# Altium schematic symbol library jlcpcb_2025_04_capacitors_extended_0201.schlib: 1175 symbols (part 3 of 7) (continued)
## FN03N470J500PLG
designator C?  Capacitance: 47pF  (hidden comment: *)
Capacitor, Ceramic (MLCC), 47pF, ±5%, 50V, C0G, ±5%, SMD 0201; Manufacturer: PSA(Prosperity Dielectrics); Manufacturer Part Number: FN03N470J500PLG; Package Size: 0201; JLCPCB Basic Part: No; JLCPCB Part Number: C561719; Supplier 1: LCSC; Category: Capacitors - MLCC; Supplier Part Number 1: C561719; Tolerance: ±5%; Voltage Rating: 50V; Temperature Coefficient: C0G; RoHS: Yes; ComponentLink1Description: Datasheet; ComponentLink2Description: JLCPCB Part URL; ComponentLink2URL: https://jlcpcb.com/partdetail/C561719; ComponentLink3Description: LCSC Part URL; ComponentLink3URL: https://lcsc.com/product-detail/Multilayer-Ceramic-Capacitors-MLCC---SMD-SMT_PSAProsperity-Dielectrics-PSAProsperity-Dielectrics-FN03N470J500PLG_C561719.html
footprint CAP-0201 (0201 (0603M) Capacitor)
pins: 1, 2

## FN03N560J500PLG
designator C?  Capacitance: 56pF  (hidden comment: *)
Capacitor, Ceramic (MLCC), 56pF, ±5%, 50V, C0G, ±5%, SMD 0201; Manufacturer: PSA(Prosperity Dielectrics); Manufacturer Part Number: FN03N560J500PLG; Package Size: 0201; JLCPCB Basic Part: No; JLCPCB Part Number: C561720; Supplier 1: LCSC; Category: Capacitors - MLCC; Supplier Part Number 1: C561720; Tolerance: ±5%; Voltage Rating: 50V; Temperature Coefficient: C0G; RoHS: Yes; ComponentLink1Description: Datasheet; ComponentLink2Description: JLCPCB Part URL; ComponentLink2URL: https://jlcpcb.com/partdetail/C561720; ComponentLink3Description: LCSC Part URL; ComponentLink3URL: https://lcsc.com/product-detail/Multilayer-Ceramic-Capacitors-MLCC---SMD-SMT_PSAProsperity-Dielectrics-PSAProsperity-Dielectrics-FN03N560J500PLG_C561720.html
footprint CAP-0201 (0201 (0603M) Capacitor)
pins: 1, 2

## FN03N680J500PLG
designator C?  Capacitance: 68pF  (hidden comment: *)
Capacitor, Ceramic (MLCC), 68pF, ±5%, 50V, C0G, ±5%, SMD 0201; Manufacturer: PSA(Prosperity Dielectrics); Manufacturer Part Number: FN03N680J500PLG; Package Size: 0201; JLCPCB Basic Part: No; JLCPCB Part Number: C561721; Supplier 1: LCSC; Category: Capacitors - MLCC; Supplier Part Number 1: C561721; Tolerance: ±5%; Voltage Rating: 50V; Temperature Coefficient: C0G; RoHS: Yes; ComponentLink1Description: Datasheet; ComponentLink2Description: JLCPCB Part URL; ComponentLink2URL: https://jlcpcb.com/partdetail/C561721; ComponentLink3Description: LCSC Part URL; ComponentLink3URL: https://lcsc.com/product-detail/Multilayer-Ceramic-Capacitors-MLCC---SMD-SMT_PSAProsperity-Dielectrics-PSAProsperity-Dielectrics-FN03N680J500PLG_C561721.html
footprint CAP-0201 (0201 (0603M) Capacitor)
pins: 1, 2

## FN03N820J500PLG
designator C?  Capacitance: 82pF  (hidden comment: *)
Capacitor, Ceramic (MLCC), 82pF, ±5%, 50V, C0G, ±5%, SMD 0201; Manufacturer: PSA(Prosperity Dielectrics); Manufacturer Part Number: FN03N820J500PLG; Package Size: 0201; JLCPCB Basic Part: No; JLCPCB Part Number: C561722; Supplier 1: LCSC; Category: Capacitors - MLCC; Supplier Part Number 1: C561722; Tolerance: ±5%; Voltage Rating: 50V; Temperature Coefficient: C0G; RoHS: Yes; ComponentLink1Description: Datasheet; ComponentLink2Description: JLCPCB Part URL; ComponentLink2URL: https://jlcpcb.com/partdetail/C561722; ComponentLink3Description: LCSC Part URL; ComponentLink3URL: https://lcsc.com/product-detail/Multilayer-Ceramic-Capacitors-MLCC---SMD-SMT_PSAProsperity-Dielectrics-PSAProsperity-Dielectrics-FN03N820J500PLG_C561722.html
footprint CAP-0201 (0201 (0603M) Capacitor)
pins: 1, 2

## FN03X102K500PLG
designator C?  Capacitance: 1nF  (hidden comment: *)
Capacitor, Ceramic (MLCC), 1nF, ±10%, 50V, X7R, ±10%, SMD 0201; Manufacturer: PSA(Prosperity Dielectrics); Manufacturer Part Number: FN03X102K500PLG; Package Size: 0201; JLCPCB Basic Part: No; JLCPCB Part Number: C2874741; Supplier 1: LCSC; Category: Capacitors - MLCC; Supplier Part Number 1: C2874741; Tolerance: ±10%; Voltage Rating: 50V; Temperature Coefficient: X7R; RoHS: Yes; ComponentLink1Description: Datasheet; ComponentLink1URL: https://wmsc.lcsc.com/wmsc/upload/file/pdf/v2/lcsc/2108150330_PSA-Prosperity-Dielectrics-FN03X102K500PLG_C2874741.pdf; ComponentLink2Description: JLCPCB Part URL; ComponentLink2URL: https://jlcpcb.com/partdetail/C2874741; ComponentLink3Description: LCSC Part URL; ComponentLink3URL: https://lcsc.com/product-detail/Multilayer-Ceramic-Capacitors-MLCC---SMD-SMT_PSAProsperity-Dielectrics-PSAProsperity-Dielectrics-FN03X102K500PLG_C2874741.html
footprint CAP-0201 (0201 (0603M) Capacitor)
pins: 1, 2

## FN03X103K100PLG
designator C?  Capacitance: 10nF  (hidden comment: *)
Capacitor, Ceramic (MLCC), 10nF, ±10%, 10V, X7R, ±10%, SMD 0201; Manufacturer: PSA(Prosperity Dielectrics); Manufacturer Part Number: FN03X103K100PLG; Package Size: 0201; JLCPCB Basic Part: No; JLCPCB Part Number: C2929123; Supplier 1: LCSC; Category: Capacitors - MLCC; Supplier Part Number 1: C2929123; Tolerance: ±10%; Voltage Rating: 10V; Temperature Coefficient: X7R; RoHS: Yes; ComponentLink1Description: Datasheet; ComponentLink1URL: https://wmsc.lcsc.com/wmsc/upload/file/pdf/v2/lcsc/2201121400_PSA-Prosperity-Dielectrics-FN03X103K100PLG_C2929123.pdf; ComponentLink2Description: JLCPCB Part URL; ComponentLink2URL: https://jlcpcb.com/partdetail/C2929123; ComponentLink3Description: LCSC Part URL; ComponentLink3URL: https://lcsc.com/product-detail/Multilayer-Ceramic-Capacitors-MLCC---SMD-SMT_PSAProsperity-Dielectrics-PSAProsperity-Dielectrics-FN03X103K100PLG_C2929123.html
footprint CAP-0201 (0201 (0603M) Capacitor)
pins: 1, 2

## FN03X151K160PLG
designator C?  Capacitance: 150pF  (hidden comment: *)
Capacitor, Ceramic (MLCC), 150pF, ±10%, 16V, X7R, ±10%, SMD 0201; Manufacturer: PSA(Prosperity Dielectrics); Manufacturer Part Number: FN03X151K160PLG; Package Size: 0201; JLCPCB Basic Part: No; JLCPCB Part Number: C565525; Supplier 1: LCSC; Category: Capacitors - MLCC; Supplier Part Number 1: C565525; Tolerance: ±10%; Voltage Rating: 16V; Temperature Coefficient: X7R; RoHS: Yes; ComponentLink1Description: Datasheet; ComponentLink2Description: JLCPCB Part URL; ComponentLink2URL: https://jlcpcb.com/partdetail/C565525; ComponentLink3Description: LCSC Part URL; ComponentLink3URL: https://lcsc.com/product-detail/Multilayer-Ceramic-Capacitors-MLCC---SMD-SMT_PSAProsperity-Dielectrics-PSAProsperity-Dielectrics-FN03X151K160PLG_C565525.html
footprint CAP-0201 (0201 (0603M) Capacitor)
pins: 1, 2

## FN03X151K250PLG
designator C?  Capacitance: 150pF  (hidden comment: *)
Capacitor, Ceramic (MLCC), 150pF, ±10%, 25V, ±10%, SMD 0201; Manufacturer: PSA(Prosperity Dielectrics); Manufacturer Part Number: FN03X151K250PLG; Package Size: 0201; JLCPCB Basic Part: No; JLCPCB Part Number: C565526; Supplier 1: LCSC; Category: Capacitors - MLCC; Supplier Part Number 1: C565526; Tolerance: ±10%; Voltage Rating: 25V; RoHS: Yes; ComponentLink1Description: Datasheet; ComponentLink2Description: JLCPCB Part URL; ComponentLink2URL: https://jlcpcb.com/partdetail/C565526; ComponentLink3Description: LCSC Part URL; ComponentLink3URL: https://lcsc.com/product-detail/Multilayer-Ceramic-Capacitors-MLCC---SMD-SMT_PSAProsperity-Dielectrics-PSAProsperity-Dielectrics-FN03X151K250PLG_C565526.html
footprint CAP-0201 (0201 (0603M) Capacitor)
pins: 1, 2

## FN03X151K500PLG
designator C?  Capacitance: 150pF  (hidden comment: *)
Capacitor, Ceramic (MLCC), 150pF, ±10%, 50V, ±10%, SMD 0201; Manufacturer: PSA(Prosperity Dielectrics); Manufacturer Part Number: FN03X151K500PLG; Package Size: 0201; JLCPCB Basic Part: No; JLCPCB Part Number: C565527; Supplier 1: LCSC; Category: Capacitors - MLCC; Supplier Part Number 1: C565527; Tolerance: ±10%; Voltage Rating: 50V; RoHS: Yes; ComponentLink1Description: Datasheet; ComponentLink2Description: JLCPCB Part URL; ComponentLink2URL: https://jlcpcb.com/partdetail/C565527; ComponentLink3Description: LCSC Part URL; ComponentLink3URL: https://lcsc.com/product-detail/Multilayer-Ceramic-Capacitors-MLCC---SMD-SMT_PSAProsperity-Dielectrics-PSAProsperity-Dielectrics-FN03X151K500PLG_C565527.html
footprint CAP-0201 (0201 (0603M) Capacitor)
pins: 1, 2

## FN03X221K250PLG
designator C?  Capacitance: 220pF  (hidden comment: *)
Capacitor, Ceramic (MLCC), 220pF, ±10%, 25V, X7R, ±10%, SMD 0201; Manufacturer: PSA(Prosperity Dielectrics); Manufacturer Part Number: FN03X221K250PLG; Package Size: 0201; JLCPCB Basic Part: No; JLCPCB Part Number: C565495; Supplier 1: LCSC; Category: Capacitors - MLCC; Supplier Part Number 1: C565495; Tolerance: ±10%; Voltage Rating: 25V; Temperature Coefficient: X7R; RoHS: Yes; ComponentLink1Description: Datasheet; ComponentLink2Description: JLCPCB Part URL; ComponentLink2URL: https://jlcpcb.com/partdetail/C565495; ComponentLink3Description: LCSC Part URL; ComponentLink3URL: https://lcsc.com/product-detail/Multilayer-Ceramic-Capacitors-MLCC---SMD-SMT_PSAProsperity-Dielectrics-PSAProsperity-Dielectrics-FN03X221K250PLG_C565495.html
footprint CAP-0201 (0201 (0603M) Capacitor)
pins: 1, 2

## FN03X222K6R3PLG
designator C?  Capacitance: 2.2nF  (hidden comment: *)
Capacitor, Ceramic (MLCC), 2.2nF, ±10%, 6.3V, X7R, ±10%, SMD 0201; Manufacturer: PSA(Prosperity Dielectrics); Manufacturer Part Number: FN03X222K6R3PLG; Package Size: 0201; JLCPCB Basic Part: No; JLCPCB Part Number: C565530; Supplier 1: LCSC; Category: Capacitors - MLCC; Supplier Part Number 1: C565530; Tolerance: ±10%; Voltage Rating: 6.3V; Temperature Coefficient: X7R; RoHS: Yes; ComponentLink1Description: Datasheet; ComponentLink2Description: JLCPCB Part URL; ComponentLink2URL: https://jlcpcb.com/partdetail/C565530; ComponentLink3Description: LCSC Part URL; ComponentLink3URL: https://lcsc.com/product-detail/Multilayer-Ceramic-Capacitors-MLCC---SMD-SMT_PSAProsperity-Dielectrics-PSAProsperity-Dielectrics-FN03X222K6R3PLG_C565530.html
footprint CAP-0201 (0201 (0603M) Capacitor)
pins: 1, 2

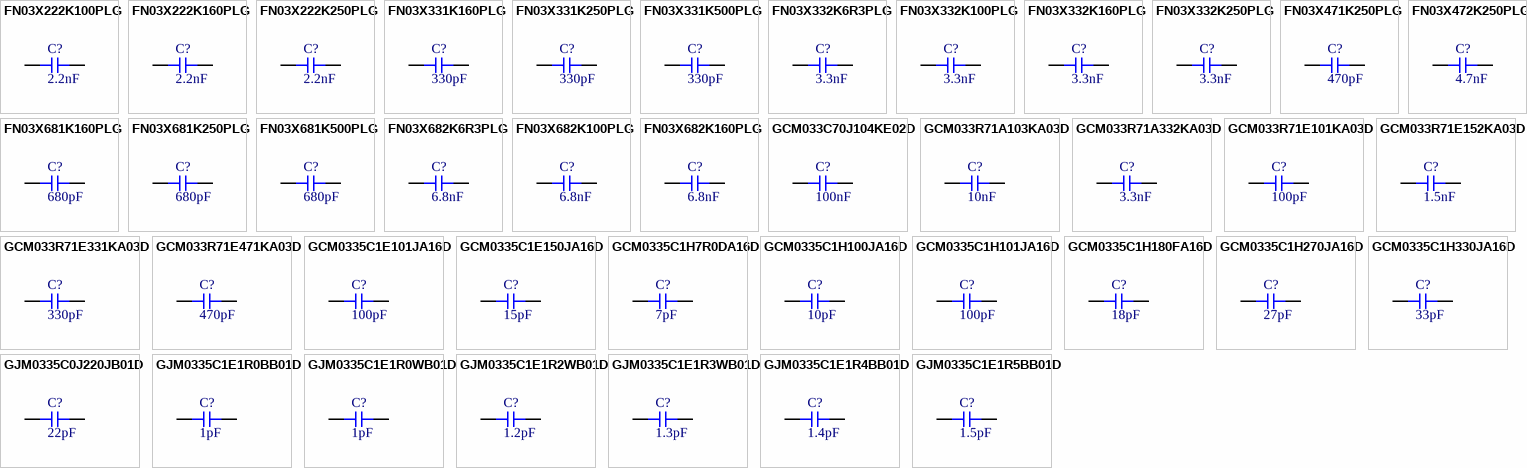
[diagram p13: symbols FN03X222K100PLG to GJM0335C1E1R5BB01D]

## FN03X222K100PLG
designator C?  Capacitance: 2.2nF  (hidden comment: *)
Capacitor, Ceramic (MLCC), 2.2nF, ±10%, 10V, X7R, ±10%, SMD 0201; Manufacturer: PSA(Prosperity Dielectrics); Manufacturer Part Number: FN03X222K100PLG; Package Size: 0201; JLCPCB Basic Part: No; JLCPCB Part Number: C565528; Supplier 1: LCSC; Category: Capacitors - MLCC; Supplier Part Number 1: C565528; Tolerance: ±10%; Voltage Rating: 10V; Temperature Coefficient: X7R; RoHS: Yes; ComponentLink1Description: Datasheet; ComponentLink2Description: JLCPCB Part URL; ComponentLink2URL: https://jlcpcb.com/partdetail/C565528; ComponentLink3Description: LCSC Part URL; ComponentLink3URL: https://lcsc.com/product-detail/Multilayer-Ceramic-Capacitors-MLCC---SMD-SMT_PSAProsperity-Dielectrics-PSAProsperity-Dielectrics-FN03X222K100PLG_C565528.html
footprint CAP-0201 (0201 (0603M) Capacitor)
pins: 1, 2

## FN03X222K160PLG
designator C?  Capacitance: 2.2nF  (hidden comment: *)
Capacitor, Ceramic (MLCC), 2.2nF, ±10%, 16V, X7R, ±10%, SMD 0201; Manufacturer: PSA(Prosperity Dielectrics); Manufacturer Part Number: FN03X222K160PLG; Package Size: 0201; JLCPCB Basic Part: No; JLCPCB Part Number: C565529; Supplier 1: LCSC; Category: Capacitors - MLCC; Supplier Part Number 1: C565529; Tolerance: ±10%; Voltage Rating: 16V; Temperature Coefficient: X7R; RoHS: Yes; ComponentLink1Description: Datasheet; ComponentLink2Description: JLCPCB Part URL; ComponentLink2URL: https://jlcpcb.com/partdetail/C565529; ComponentLink3Description: LCSC Part URL; ComponentLink3URL: https://lcsc.com/product-detail/Multilayer-Ceramic-Capacitors-MLCC---SMD-SMT_PSAProsperity-Dielectrics-PSAProsperity-Dielectrics-FN03X222K160PLG_C565529.html
footprint CAP-0201 (0201 (0603M) Capacitor)
pins: 1, 2

## FN03X222K250PLG
designator C?  Capacitance: 2.2nF  (hidden comment: *)
Capacitor, Ceramic (MLCC), 2.2nF, ±10%, 25V, X7R, ±10%, SMD 0201; Manufacturer: PSA(Prosperity Dielectrics); Manufacturer Part Number: FN03X222K250PLG; Package Size: 0201; JLCPCB Basic Part: No; JLCPCB Part Number: C565496; Supplier 1: LCSC; Category: Capacitors - MLCC; Supplier Part Number 1: C565496; Tolerance: ±10%; Voltage Rating: 25V; Temperature Coefficient: X7R; RoHS: Yes; ComponentLink1Description: Datasheet; ComponentLink2Description: JLCPCB Part URL; ComponentLink2URL: https://jlcpcb.com/partdetail/C565496; ComponentLink3Description: LCSC Part URL; ComponentLink3URL: https://lcsc.com/product-detail/Multilayer-Ceramic-Capacitors-MLCC---SMD-SMT_PSAProsperity-Dielectrics-PSAProsperity-Dielectrics-FN03X222K250PLG_C565496.html
footprint CAP-0201 (0201 (0603M) Capacitor)
pins: 1, 2

## FN03X331K160PLG
designator C?  Capacitance: 330pF  (hidden comment: *)
Capacitor, Ceramic (MLCC), 330pF, ±10%, 16V, X7R, ±10%, SMD 0201; Manufacturer: PSA(Prosperity Dielectrics); Manufacturer Part Number: FN03X331K160PLG; Package Size: 0201; JLCPCB Basic Part: No; JLCPCB Part Number: C565531; Supplier 1: LCSC; Category: Capacitors - MLCC; Supplier Part Number 1: C565531; Tolerance: ±10%; Voltage Rating: 16V; Temperature Coefficient: X7R; RoHS: Yes; ComponentLink1Description: Datasheet; ComponentLink2Description: JLCPCB Part URL; ComponentLink2URL: https://jlcpcb.com/partdetail/C565531; ComponentLink3Description: LCSC Part URL; ComponentLink3URL: https://lcsc.com/product-detail/Multilayer-Ceramic-Capacitors-MLCC---SMD-SMT_PSAProsperity-Dielectrics-PSAProsperity-Dielectrics-FN03X331K160PLG_C565531.html
footprint CAP-0201 (0201 (0603M) Capacitor)
pins: 1, 2

## FN03X331K250PLG
designator C?  Capacitance: 330pF  (hidden comment: *)
Capacitor, Ceramic (MLCC), 330pF, ±10%, 25V, X7R, ±10%, SMD 0201; Manufacturer: PSA(Prosperity Dielectrics); Manufacturer Part Number: FN03X331K250PLG; Package Size: 0201; JLCPCB Basic Part: No; JLCPCB Part Number: C565532; Supplier 1: LCSC; Category: Capacitors - MLCC; Supplier Part Number 1: C565532; Tolerance: ±10%; Voltage Rating: 25V; Temperature Coefficient: X7R; RoHS: Yes; ComponentLink1Description: Datasheet; ComponentLink2Description: JLCPCB Part URL; ComponentLink2URL: https://jlcpcb.com/partdetail/C565532; ComponentLink3Description: LCSC Part URL; ComponentLink3URL: https://lcsc.com/product-detail/Multilayer-Ceramic-Capacitors-MLCC---SMD-SMT_PSAProsperity-Dielectrics-PSAProsperity-Dielectrics-FN03X331K250PLG_C565532.html
footprint CAP-0201 (0201 (0603M) Capacitor)
pins: 1, 2

## FN03X331K500PLG
designator C?  Capacitance: 330pF  (hidden comment: *)
Capacitor, Ceramic (MLCC), 330pF, ±10%, 50V, X7R, ±10%, SMD 0201; Manufacturer: PSA(Prosperity Dielectrics); Manufacturer Part Number: FN03X331K500PLG; Package Size: 0201; JLCPCB Basic Part: No; JLCPCB Part Number: C565533; Supplier 1: LCSC; Category: Capacitors - MLCC; Supplier Part Number 1: C565533; Tolerance: ±10%; Voltage Rating: 50V; Temperature Coefficient: X7R; RoHS: Yes; ComponentLink1Description: Datasheet; ComponentLink2Description: JLCPCB Part URL; ComponentLink2URL: https://jlcpcb.com/partdetail/C565533; ComponentLink3Description: LCSC Part URL; ComponentLink3URL: https://lcsc.com/product-detail/Multilayer-Ceramic-Capacitors-MLCC---SMD-SMT_PSAProsperity-Dielectrics-PSAProsperity-Dielectrics-FN03X331K500PLG_C565533.html
footprint CAP-0201 (0201 (0603M) Capacitor)
pins: 1, 2

## FN03X332K6R3PLG
designator C?  Capacitance: 3.3nF  (hidden comment: *)
Capacitor, Ceramic (MLCC), 3.3nF, ±10%, 6.3V, ±10%, SMD 0201; Manufacturer: PSA(Prosperity Dielectrics); Manufacturer Part Number: FN03X332K6R3PLG; Package Size: 0201; JLCPCB Basic Part: No; JLCPCB Part Number: C565537; Supplier 1: LCSC; Category: Capacitors - MLCC; Supplier Part Number 1: C565537; Tolerance: ±10%; Voltage Rating: 6.3V; RoHS: Yes; ComponentLink1Description: Datasheet; ComponentLink2Description: JLCPCB Part URL; ComponentLink2URL: https://jlcpcb.com/partdetail/C565537; ComponentLink3Description: LCSC Part URL; ComponentLink3URL: https://lcsc.com/product-detail/Multilayer-Ceramic-Capacitors-MLCC---SMD-SMT_PSAProsperity-Dielectrics-PSAProsperity-Dielectrics-FN03X332K6R3PLG_C565537.html
footprint CAP-0201 (0201 (0603M) Capacitor)
pins: 1, 2

## FN03X332K100PLG
designator C?  Capacitance: 3.3nF  (hidden comment: *)
Capacitor, Ceramic (MLCC), 3.3nF, ±10%, 10V, ±10%, SMD 0201; Manufacturer: PSA(Prosperity Dielectrics); Manufacturer Part Number: FN03X332K100PLG; Package Size: 0201; JLCPCB Basic Part: No; JLCPCB Part Number: C565534; Supplier 1: LCSC; Category: Capacitors - MLCC; Supplier Part Number 1: C565534; Tolerance: ±10%; Voltage Rating: 10V; RoHS: Yes; ComponentLink1Description: Datasheet; ComponentLink2Description: JLCPCB Part URL; ComponentLink2URL: https://jlcpcb.com/partdetail/C565534; ComponentLink3Description: LCSC Part URL; ComponentLink3URL: https://lcsc.com/product-detail/Multilayer-Ceramic-Capacitors-MLCC---SMD-SMT_PSAProsperity-Dielectrics-PSAProsperity-Dielectrics-FN03X332K100PLG_C565534.html
footprint CAP-0201 (0201 (0603M) Capacitor)
pins: 1, 2

## FN03X332K160PLG
designator C?  Capacitance: 3.3nF  (hidden comment: *)
Capacitor, Ceramic (MLCC), 3.3nF, ±10%, 16V, ±10%, SMD 0201; Manufacturer: PSA(Prosperity Dielectrics); Manufacturer Part Number: FN03X332K160PLG; Package Size: 0201; JLCPCB Basic Part: No; JLCPCB Part Number: C565535; Supplier 1: LCSC; Category: Capacitors - MLCC; Supplier Part Number 1: C565535; Tolerance: ±10%; Voltage Rating: 16V; RoHS: Yes; ComponentLink1Description: Datasheet; ComponentLink2Description: JLCPCB Part URL; ComponentLink2URL: https://jlcpcb.com/partdetail/C565535; ComponentLink3Description: LCSC Part URL; ComponentLink3URL: https://lcsc.com/product-detail/Multilayer-Ceramic-Capacitors-MLCC---SMD-SMT_PSAProsperity-Dielectrics-PSAProsperity-Dielectrics-FN03X332K160PLG_C565535.html
footprint CAP-0201 (0201 (0603M) Capacitor)
pins: 1, 2

## FN03X332K250PLG
designator C?  Capacitance: 3.3nF  (hidden comment: *)
Capacitor, Ceramic (MLCC), 3.3nF, ±10%, 25V, ±10%, SMD 0201; Manufacturer: PSA(Prosperity Dielectrics); Manufacturer Part Number: FN03X332K250PLG; Package Size: 0201; JLCPCB Basic Part: No; JLCPCB Part Number: C565536; Supplier 1: LCSC; Category: Capacitors - MLCC; Supplier Part Number 1: C565536; Tolerance: ±10%; Voltage Rating: 25V; RoHS: Yes; ComponentLink1Description: Datasheet; ComponentLink2Description: JLCPCB Part URL; ComponentLink2URL: https://jlcpcb.com/partdetail/C565536; ComponentLink3Description: LCSC Part URL; ComponentLink3URL: https://lcsc.com/product-detail/Multilayer-Ceramic-Capacitors-MLCC---SMD-SMT_PSAProsperity-Dielectrics-PSAProsperity-Dielectrics-FN03X332K250PLG_C565536.html
footprint CAP-0201 (0201 (0603M) Capacitor)
pins: 1, 2

## FN03X471K250PLG
designator C?  Capacitance: 470pF  (hidden comment: *)
Capacitor, Ceramic (MLCC), 470pF, ±10%, 25V, X7R, ±10%, SMD 0201; Manufacturer: PSA(Prosperity Dielectrics); Manufacturer Part Number: FN03X471K250PLG; Package Size: 0201; JLCPCB Basic Part: No; JLCPCB Part Number: C565497; Supplier 1: LCSC; Category: Capacitors - MLCC; Supplier Part Number 1: C565497; Tolerance: ±10%; Voltage Rating: 25V; Temperature Coefficient: X7R; RoHS: Yes; ComponentLink1Description: Datasheet; ComponentLink2Description: JLCPCB Part URL; ComponentLink2URL: https://jlcpcb.com/partdetail/C565497; ComponentLink3Description: LCSC Part URL; ComponentLink3URL: https://lcsc.com/product-detail/Multilayer-Ceramic-Capacitors-MLCC---SMD-SMT_PSAProsperity-Dielectrics-PSAProsperity-Dielectrics-FN03X471K250PLG_C565497.html
footprint CAP-0201 (0201 (0603M) Capacitor)
pins: 1, 2

## FN03X472K250PLG
designator C?  Capacitance: 4.7nF  (hidden comment: *)
Capacitor, Ceramic (MLCC), 4.7nF, ±10%, 25V, X7R, ±10%, SMD 0201; Manufacturer: PSA(Prosperity Dielectrics); Manufacturer Part Number: FN03X472K250PLG; Package Size: 0201; JLCPCB Basic Part: No; JLCPCB Part Number: C565498; Supplier 1: LCSC; Category: Capacitors - MLCC; Supplier Part Number 1: C565498; Tolerance: ±10%; Voltage Rating: 25V; Temperature Coefficient: X7R; RoHS: Yes; ComponentLink1Description: Datasheet; ComponentLink2Description: JLCPCB Part URL; ComponentLink2URL: https://jlcpcb.com/partdetail/C565498; ComponentLink3Description: LCSC Part URL; ComponentLink3URL: https://lcsc.com/product-detail/Multilayer-Ceramic-Capacitors-MLCC---SMD-SMT_PSAProsperity-Dielectrics-PSAProsperity-Dielectrics-FN03X472K250PLG_C565498.html
footprint CAP-0201 (0201 (0603M) Capacitor)
pins: 1, 2

## FN03X681K160PLG
designator C?  Capacitance: 680pF  (hidden comment: *)
Capacitor, Ceramic (MLCC), 680pF, ±10%, 16V, X7R, ±10%, SMD 0201; Manufacturer: PSA(Prosperity Dielectrics); Manufacturer Part Number: FN03X681K160PLG; Package Size: 0201; JLCPCB Basic Part: No; JLCPCB Part Number: C565538; Supplier 1: LCSC; Category: Capacitors - MLCC; Supplier Part Number 1: C565538; Tolerance: ±10%; Voltage Rating: 16V; Temperature Coefficient: X7R; RoHS: Yes; ComponentLink1Description: Datasheet; ComponentLink2Description: JLCPCB Part URL; ComponentLink2URL: https://jlcpcb.com/partdetail/C565538; ComponentLink3Description: LCSC Part URL; ComponentLink3URL: https://lcsc.com/product-detail/Multilayer-Ceramic-Capacitors-MLCC---SMD-SMT_PSAProsperity-Dielectrics-PSAProsperity-Dielectrics-FN03X681K160PLG_C565538.html
footprint CAP-0201 (0201 (0603M) Capacitor)
pins: 1, 2

## FN03X681K250PLG
designator C?  Capacitance: 680pF  (hidden comment: *)
Capacitor, Ceramic (MLCC), 680pF, ±10%, 25V, X7R, ±10%, SMD 0201; Manufacturer: PSA(Prosperity Dielectrics); Manufacturer Part Number: FN03X681K250PLG; Package Size: 0201; JLCPCB Basic Part: No; JLCPCB Part Number: C565539; Supplier 1: LCSC; Category: Capacitors - MLCC; Supplier Part Number 1: C565539; Tolerance: ±10%; Voltage Rating: 25V; Temperature Coefficient: X7R; RoHS: Yes; ComponentLink1Description: Datasheet; ComponentLink2Description: JLCPCB Part URL; ComponentLink2URL: https://jlcpcb.com/partdetail/C565539; ComponentLink3Description: LCSC Part URL; ComponentLink3URL: https://lcsc.com/product-detail/Multilayer-Ceramic-Capacitors-MLCC---SMD-SMT_PSAProsperity-Dielectrics-PSAProsperity-Dielectrics-FN03X681K250PLG_C565539.html
footprint CAP-0201 (0201 (0603M) Capacitor)
pins: 1, 2

## FN03X681K500PLG
designator C?  Capacitance: 680pF  (hidden comment: *)
Capacitor, Ceramic (MLCC), 680pF, ±10%, 50V, X7R, ±10%, SMD 0201; Manufacturer: PSA(Prosperity Dielectrics); Manufacturer Part Number: FN03X681K500PLG; Package Size: 0201; JLCPCB Basic Part: No; JLCPCB Part Number: C565540; Supplier 1: LCSC; Category: Capacitors - MLCC; Supplier Part Number 1: C565540; Tolerance: ±10%; Voltage Rating: 50V; Temperature Coefficient: X7R; RoHS: Yes; ComponentLink1Description: Datasheet; ComponentLink2Description: JLCPCB Part URL; ComponentLink2URL: https://jlcpcb.com/partdetail/C565540; ComponentLink3Description: LCSC Part URL; ComponentLink3URL: https://lcsc.com/product-detail/Multilayer-Ceramic-Capacitors-MLCC---SMD-SMT_PSAProsperity-Dielectrics-PSAProsperity-Dielectrics-FN03X681K500PLG_C565540.html
footprint CAP-0201 (0201 (0603M) Capacitor)
pins: 1, 2

## FN03X682K6R3PLG
designator C?  Capacitance: 6.8nF  (hidden comment: *)
Capacitor, Ceramic (MLCC), 6.8nF, ±10%, 6.3V, X7R, ±10%, SMD 0201; Manufacturer: PSA(Prosperity Dielectrics); Manufacturer Part Number: FN03X682K6R3PLG; Package Size: 0201; JLCPCB Basic Part: No; JLCPCB Part Number: C565543; Supplier 1: LCSC; Category: Capacitors - MLCC; Supplier Part Number 1: C565543; Tolerance: ±10%; Voltage Rating: 6.3V; Temperature Coefficient: X7R; RoHS: Yes; ComponentLink1Description: Datasheet; ComponentLink2Description: JLCPCB Part URL; ComponentLink2URL: https://jlcpcb.com/partdetail/C565543; ComponentLink3Description: LCSC Part URL; ComponentLink3URL: https://lcsc.com/product-detail/Multilayer-Ceramic-Capacitors-MLCC---SMD-SMT_PSAProsperity-Dielectrics-PSAProsperity-Dielectrics-FN03X682K6R3PLG_C565543.html
footprint CAP-0201 (0201 (0603M) Capacitor)
pins: 1, 2

## FN03X682K100PLG
designator C?  Capacitance: 6.8nF  (hidden comment: *)
Capacitor, Ceramic (MLCC), 6.8nF, ±10%, 10V, X7R, ±10%, SMD 0201; Manufacturer: PSA(Prosperity Dielectrics); Manufacturer Part Number: FN03X682K100PLG; Package Size: 0201; JLCPCB Basic Part: No; JLCPCB Part Number: C565541; Supplier 1: LCSC; Category: Capacitors - MLCC; Supplier Part Number 1: C565541; Tolerance: ±10%; Voltage Rating: 10V; Temperature Coefficient: X7R; RoHS: Yes; ComponentLink1Description: Datasheet; ComponentLink2Description: JLCPCB Part URL; ComponentLink2URL: https://jlcpcb.com/partdetail/C565541; ComponentLink3Description: LCSC Part URL; ComponentLink3URL: https://lcsc.com/product-detail/Multilayer-Ceramic-Capacitors-MLCC---SMD-SMT_PSAProsperity-Dielectrics-PSAProsperity-Dielectrics-FN03X682K100PLG_C565541.html
footprint CAP-0201 (0201 (0603M) Capacitor)
pins: 1, 2

## FN03X682K160PLG
designator C?  Capacitance: 6.8nF  (hidden comment: *)
Capacitor, Ceramic (MLCC), 6.8nF, ±10%, 16V, X7R, ±10%, SMD 0201; Manufacturer: PSA(Prosperity Dielectrics); Manufacturer Part Number: FN03X682K160PLG; Package Size: 0201; JLCPCB Basic Part: No; JLCPCB Part Number: C565542; Supplier 1: LCSC; Category: Capacitors - MLCC; Supplier Part Number 1: C565542; Tolerance: ±10%; Voltage Rating: 16V; Temperature Coefficient: X7R; RoHS: Yes; ComponentLink1Description: Datasheet; ComponentLink2Description: JLCPCB Part URL; ComponentLink2URL: https://jlcpcb.com/partdetail/C565542; ComponentLink3Description: LCSC Part URL; ComponentLink3URL: https://lcsc.com/product-detail/Multilayer-Ceramic-Capacitors-MLCC---SMD-SMT_PSAProsperity-Dielectrics-PSAProsperity-Dielectrics-FN03X682K160PLG_C565542.html
footprint CAP-0201 (0201 (0603M) Capacitor)
pins: 1, 2

## GCM033C70J104KE02D
designator C?  Capacitance: 100nF  (hidden comment: *)
Capacitor, Ceramic (MLCC), 100nF, 6.3V, X7S, SMD 0201; Manufacturer: Murata Electronics; Manufacturer Part Number: GCM033C70J104KE02D; Package Size: 0201; JLCPCB Basic Part: No; JLCPCB Part Number: C2981726; Supplier 1: LCSC; Category: Capacitors - MLCC; Supplier Part Number 1: C2981726; Voltage Rating: 6.3V; Temperature Coefficient: X7S; RoHS: Yes; ComponentLink1Description: Datasheet; ComponentLink1URL: https://wmsc.lcsc.com/wmsc/upload/file/pdf/v2/lcsc/2208241730_Murata-Electronics-GCM033C70J104KE02D_C2981726.pdf; ComponentLink2Description: JLCPCB Part URL; ComponentLink2URL: https://jlcpcb.com/partdetail/C2981726; ComponentLink3Description: LCSC Part URL; ComponentLink3URL: https://lcsc.com/product-detail/Multilayer-Ceramic-Capacitors-MLCC---SMD-SMT_Murata-Electronics-Murata-Electronics-GCM033C70J104KE02D_C2981726.html
footprint CAP-0201 (0201 (0603M) Capacitor)
pins: 1, 2

## GCM033R71A103KA03D
designator C?  Capacitance: 10nF  (hidden comment: *)
Capacitor, Ceramic (MLCC), 10nF, ±10%, 10V, ±10%, SMD 0201; Manufacturer: Murata Electronics; Manufacturer Part Number: GCM033R71A103KA03D; Package Size: 0201; JLCPCB Basic Part: No; JLCPCB Part Number: C524550; Supplier 1: LCSC; Category: Capacitors - MLCC; Supplier Part Number 1: C524550; Tolerance: ±10%; Voltage Rating: 10V; RoHS: Yes; ComponentLink1Description: Datasheet; ComponentLink1URL: https://wmsc.lcsc.com/wmsc/upload/file/pdf/v2/lcsc/2304140030_Murata-Electronics-GCM033R71A103KA03D_C524550.pdf; ComponentLink2Description: JLCPCB Part URL; ComponentLink2URL: https://jlcpcb.com/partdetail/C524550; ComponentLink3Description: LCSC Part URL; ComponentLink3URL: https://lcsc.com/product-detail/Multilayer-Ceramic-Capacitors-MLCC---SMD-SMT_Murata-Electronics-Murata-Electronics-GCM033R71A103KA03D_C524550.html
footprint CAP-0201 (0201 (0603M) Capacitor)
pins: 1, 2

## GCM033R71A332KA03D
designator C?  Capacitance: 3.3nF  (hidden comment: *)
Capacitor, Ceramic (MLCC), 3.3nF, ±10%, 10V, X7R, ±10%, SMD 0201; Manufacturer: Murata Electronics; Manufacturer Part Number: GCM033R71A332KA03D; Package Size: 0201; JLCPCB Basic Part: No; JLCPCB Part Number: C2986279; Supplier 1: LCSC; Category: Capacitors - MLCC; Supplier Part Number 1: C2986279; Tolerance: ±10%; Voltage Rating: 10V; Temperature Coefficient: X7R; RoHS: Yes; ComponentLink1Description: Datasheet; ComponentLink1URL: https://wmsc.lcsc.com/wmsc/upload/file/pdf/v2/lcsc/2204251600_Murata-Electronics-GCM033R71A332KA03D_C2986279.pdf; ComponentLink2Description: JLCPCB Part URL; ComponentLink2URL: https://jlcpcb.com/partdetail/C2986279; ComponentLink3Description: LCSC Part URL; ComponentLink3URL: https://lcsc.com/product-detail/Multilayer-Ceramic-Capacitors-MLCC---SMD-SMT_Murata-Electronics-Murata-Electronics-GCM033R71A332KA03D_C2986279.html
footprint CAP-0201 (0201 (0603M) Capacitor)
pins: 1, 2

## GCM033R71E101KA03D
designator C?  Capacitance: 100pF  (hidden comment: *)
Capacitor, Ceramic (MLCC), 100pF, ±10%, 25V, X7R, ±10%, SMD 0201; Manufacturer: Murata Electronics; Manufacturer Part Number: GCM033R71E101KA03D; Package Size: 0201; JLCPCB Basic Part: No; JLCPCB Part Number: C710641; Supplier 1: LCSC; Category: Capacitors - MLCC; Supplier Part Number 1: C710641; Tolerance: ±10%; Voltage Rating: 25V; Temperature Coefficient: X7R; RoHS: Yes; ComponentLink1Description: Datasheet; ComponentLink1URL: https://wmsc.lcsc.com/wmsc/upload/file/pdf/v2/lcsc/2308111811_Murata-Electronics-GCM033R71E101KA03D_C710641.pdf; ComponentLink2Description: JLCPCB Part URL; ComponentLink2URL: https://jlcpcb.com/partdetail/C710641; ComponentLink3Description: LCSC Part URL; ComponentLink3URL: https://lcsc.com/product-detail/Multilayer-Ceramic-Capacitors-MLCC---SMD-SMT_Murata-Electronics-Murata-Electronics-GCM033R71E101KA03D_C710641.html
footprint CAP-0201 (0201 (0603M) Capacitor)
pins: 1, 2

## GCM033R71E152KA03D
designator C?  Capacitance: 1.5nF  (hidden comment: *)
Capacitor, Ceramic (MLCC), 1.5nF, ±10%, 25V, X7R, ±10%, SMD 0201; Manufacturer: Murata Electronics; Manufacturer Part Number: GCM033R71E152KA03D; Package Size: 0201; JLCPCB Basic Part: No; JLCPCB Part Number: C2168673; Supplier 1: LCSC; Category: Capacitors - MLCC; Supplier Part Number 1: C2168673; Tolerance: ±10%; Voltage Rating: 25V; Temperature Coefficient: X7R; RoHS: Yes; ComponentLink1Description: Datasheet; ComponentLink1URL: https://wmsc.lcsc.com/wmsc/upload/file/pdf/v2/lcsc/2308111716_Murata-Electronics-GCM033R71E152KA03D_C2168673.pdf; ComponentLink2Description: JLCPCB Part URL; ComponentLink2URL: https://jlcpcb.com/partdetail/C2168673; ComponentLink3Description: LCSC Part URL; ComponentLink3URL: https://lcsc.com/product-detail/Multilayer-Ceramic-Capacitors-MLCC---SMD-SMT_Murata-Electronics-Murata-Electronics-GCM033R71E152KA03D_C2168673.html
footprint CAP-0201 (0201 (0603M) Capacitor)
pins: 1, 2

## GCM033R71E331KA03D
designator C?  Capacitance: 330pF  (hidden comment: *)
Capacitor, Ceramic (MLCC), 330pF, ±10%, 25V, X7R, ±10%, SMD 0201; Manufacturer: Murata Electronics; Manufacturer Part Number: GCM033R71E331KA03D; Package Size: 0201; JLCPCB Basic Part: No; JLCPCB Part Number: C2184280; Supplier 1: LCSC; Category: Capacitors - MLCC; Supplier Part Number 1: C2184280; Tolerance: ±10%; Voltage Rating: 25V; Temperature Coefficient: X7R; RoHS: Yes; ComponentLink1Description: Datasheet; ComponentLink1URL: https://wmsc.lcsc.com/wmsc/upload/file/pdf/v2/lcsc/2308111720_Murata-Electronics-GCM033R71E331KA03D_C2184280.pdf; ComponentLink2Description: JLCPCB Part URL; ComponentLink2URL: https://jlcpcb.com/partdetail/C2184280; ComponentLink3Description: LCSC Part URL; ComponentLink3URL: https://lcsc.com/product-detail/Multilayer-Ceramic-Capacitors-MLCC---SMD-SMT_Murata-Electronics-Murata-Electronics-GCM033R71E331KA03D_C2184280.html
footprint CAP-0201 (0201 (0603M) Capacitor)
pins: 1, 2

## GCM033R71E471KA03D
designator C?  Capacitance: 470pF  (hidden comment: *)
Capacitor, Ceramic (MLCC), 470pF, ±10%, 25V, X7R, ±10%, SMD 0201; Manufacturer: Murata Electronics; Manufacturer Part Number: GCM033R71E471KA03D; Package Size: 0201; JLCPCB Basic Part: No; JLCPCB Part Number: C710642; Supplier 1: LCSC; Category: Capacitors - MLCC; Supplier Part Number 1: C710642; Tolerance: ±10%; Voltage Rating: 25V; Temperature Coefficient: X7R; RoHS: Yes; ComponentLink1Description: Datasheet; ComponentLink1URL: https://wmsc.lcsc.com/wmsc/upload/file/pdf/v2/lcsc/2104061735_Murata-Electronics-GCM033R71E471KA03D_C710642.pdf; ComponentLink2Description: JLCPCB Part URL; ComponentLink2URL: https://jlcpcb.com/partdetail/C710642; ComponentLink3Description: LCSC Part URL; ComponentLink3URL: https://lcsc.com/product-detail/Multilayer-Ceramic-Capacitors-MLCC---SMD-SMT_Murata-Electronics-Murata-Electronics-GCM033R71E471KA03D_C710642.html
footprint CAP-0201 (0201 (0603M) Capacitor)
pins: 1, 2

## GCM0335C1E101JA16D
designator C?  Capacitance: 100pF  (hidden comment: *)
Capacitor, Ceramic (MLCC), 100pF, ±5%, 25V, C0G, ±5%, SMD 0201; Manufacturer: Murata Electronics; Manufacturer Part Number: GCM0335C1E101JA16D; Package Size: 0201; JLCPCB Basic Part: No; JLCPCB Part Number: C161128; Supplier 1: LCSC; Category: Capacitors - MLCC; Supplier Part Number 1: C161128; Tolerance: ±5%; Voltage Rating: 25V; Temperature Coefficient: C0G; RoHS: Yes; ComponentLink1Description: Datasheet; ComponentLink1URL: https://wmsc.lcsc.com/wmsc/upload/file/pdf/v2/lcsc/2304140030_Murata-Electronics-GCM0335C1E101JA16D_C161128.pdf; ComponentLink2Description: JLCPCB Part URL; ComponentLink2URL: https://jlcpcb.com/partdetail/C161128; ComponentLink3Description: LCSC Part URL; ComponentLink3URL: https://lcsc.com/product-detail/Multilayer-Ceramic-Capacitors-MLCC---SMD-SMT_Murata-Electronics-Murata-Electronics-GCM0335C1E101JA16D_C161128.html
footprint CAP-0201 (0201 (0603M) Capacitor)
pins: 1, 2

## GCM0335C1E150JA16D
designator C?  Capacitance: 15pF  (hidden comment: *)
Capacitor, Ceramic (MLCC), 15pF, ±5%, 25V, ±5%, SMD 0201; Manufacturer: Murata Electronics; Manufacturer Part Number: GCM0335C1E150JA16D; Package Size: 0201; JLCPCB Basic Part: No; JLCPCB Part Number: C2184276; Supplier 1: LCSC; Category: Capacitors - MLCC; Supplier Part Number 1: C2184276; Tolerance: ±5%; Voltage Rating: 25V; RoHS: Yes; ComponentLink1Description: Datasheet; ComponentLink1URL: https://wmsc.lcsc.com/wmsc/upload/file/pdf/v2/lcsc/2308111720_Murata-Electronics-GCM0335C1E150JA16D_C2184276.pdf; ComponentLink2Description: JLCPCB Part URL; ComponentLink2URL: https://jlcpcb.com/partdetail/C2184276; ComponentLink3Description: LCSC Part URL; ComponentLink3URL: https://lcsc.com/product-detail/Multilayer-Ceramic-Capacitors-MLCC---SMD-SMT_Murata-Electronics-Murata-Electronics-GCM0335C1E150JA16D_C2184276.html
footprint CAP-0201 (0201 (0603M) Capacitor)
pins: 1, 2

## GCM0335C1H7R0DA16D
designator C?  Capacitance: 7pF  (hidden comment: *)
Capacitor, Ceramic (MLCC), 7pF, 50V, C0G, SMD 0201; Manufacturer: Murata Electronics; Manufacturer Part Number: GCM0335C1H7R0DA16D; Package Size: 0201; JLCPCB Basic Part: No; JLCPCB Part Number: C161143; Supplier 1: LCSC; Category: Capacitors - MLCC; Supplier Part Number 1: C161143; Voltage Rating: 50V; Temperature Coefficient: C0G; RoHS: Yes; ComponentLink1Description: Datasheet; ComponentLink1URL: https://wmsc.lcsc.com/wmsc/upload/file/pdf/v2/lcsc/1811081551_Murata-Electronics-GCM0335C1H7R0DA16D_C161143.pdf; ComponentLink2Description: JLCPCB Part URL; ComponentLink2URL: https://jlcpcb.com/partdetail/C161143; ComponentLink3Description: LCSC Part URL; ComponentLink3URL: https://lcsc.com/product-detail/Multilayer-Ceramic-Capacitors-MLCC---SMD-SMT_Murata-Electronics-Murata-Electronics-GCM0335C1H7R0DA16D_C161143.html
footprint CAP-0201 (0201 (0603M) Capacitor)
pins: 1, 2

## GCM0335C1H100JA16D
designator C?  Capacitance: 10pF  (hidden comment: *)
Capacitor, Ceramic (MLCC), 10pF, ±5%, 50V, C0G, ±5%, SMD 0201; Manufacturer: Murata Electronics; Manufacturer Part Number: GCM0335C1H100JA16D; Package Size: 0201; JLCPCB Basic Part: No; JLCPCB Part Number: C161130; Supplier 1: LCSC; Category: Capacitors - MLCC; Supplier Part Number 1: C161130; Tolerance: ±5%; Voltage Rating: 50V; Temperature Coefficient: C0G; RoHS: Yes; ComponentLink1Description: Datasheet; ComponentLink1URL: https://wmsc.lcsc.com/wmsc/upload/file/pdf/v2/lcsc/1811081550_Murata-Electronics-GCM0335C1H100JA16D_C161130.pdf; ComponentLink2Description: JLCPCB Part URL; ComponentLink2URL: https://jlcpcb.com/partdetail/C161130; ComponentLink3Description: LCSC Part URL; ComponentLink3URL: https://lcsc.com/product-detail/Multilayer-Ceramic-Capacitors-MLCC---SMD-SMT_Murata-Electronics-Murata-Electronics-GCM0335C1H100JA16D_C161130.html
footprint CAP-0201 (0201 (0603M) Capacitor)
pins: 1, 2

## GCM0335C1H101JA16D
designator C?  Capacitance: 100pF  (hidden comment: *)
Capacitor, Ceramic (MLCC), 100pF, ±5%, 50V, C0G, ±5%, SMD 0201; Manufacturer: Murata Electronics; Manufacturer Part Number: GCM0335C1H101JA16D; Package Size: 0201; JLCPCB Basic Part: No; JLCPCB Part Number: C161131; Supplier 1: LCSC; Category: Capacitors - MLCC; Supplier Part Number 1: C161131; Tolerance: ±5%; Voltage Rating: 50V; Temperature Coefficient: C0G; RoHS: Yes; ComponentLink1Description: Datasheet; ComponentLink1URL: https://wmsc.lcsc.com/wmsc/upload/file/pdf/v2/lcsc/1811081550_Murata-Electronics-GCM0335C1H101JA16D_C161131.pdf; ComponentLink2Description: JLCPCB Part URL; ComponentLink2URL: https://jlcpcb.com/partdetail/C161131; ComponentLink3Description: LCSC Part URL; ComponentLink3URL: https://lcsc.com/product-detail/Multilayer-Ceramic-Capacitors-MLCC---SMD-SMT_Murata-Electronics-Murata-Electronics-GCM0335C1H101JA16D_C161131.html
footprint CAP-0201 (0201 (0603M) Capacitor)
pins: 1, 2

## GCM0335C1H180FA16D
designator C?  Capacitance: 18pF  (hidden comment: *)
Capacitor, Ceramic (MLCC), 18pF, ±1%, 50V, C0G, ±1%, SMD 0201; Manufacturer: Murata Electronics; Manufacturer Part Number: GCM0335C1H180FA16D; Package Size: 0201; JLCPCB Basic Part: No; JLCPCB Part Number: C1864228; Supplier 1: LCSC; Category: Capacitors - MLCC; Supplier Part Number 1: C1864228; Tolerance: ±1%; Voltage Rating: 50V; Temperature Coefficient: C0G; RoHS: Yes; ComponentLink1Description: Datasheet; ComponentLink1URL: https://wmsc.lcsc.com/wmsc/upload/file/pdf/v2/lcsc/2201271800_Murata-Electronics-GCM0335C1H180FA16D_C1864228.pdf; ComponentLink2Description: JLCPCB Part URL; ComponentLink2URL: https://jlcpcb.com/partdetail/C1864228; ComponentLink3Description: LCSC Part URL; ComponentLink3URL: https://lcsc.com/product-detail/Multilayer-Ceramic-Capacitors-MLCC---SMD-SMT_Murata-Electronics-Murata-Electronics-GCM0335C1H180FA16D_C1864228.html
footprint CAP-0201 (0201 (0603M) Capacitor)
pins: 1, 2

## GCM0335C1H270JA16D
designator C?  Capacitance: 27pF  (hidden comment: *)
Capacitor, Ceramic (MLCC), 27pF, ±5%, 50V, ±5%, SMD 0201; Manufacturer: Murata Electronics; Manufacturer Part Number: GCM0335C1H270JA16D; Package Size: 0201; JLCPCB Basic Part: No; JLCPCB Part Number: C1849653; Supplier 1: LCSC; Category: Capacitors - MLCC; Supplier Part Number 1: C1849653; Tolerance: ±5%; Voltage Rating: 50V; RoHS: Yes; ComponentLink1Description: Datasheet; ComponentLink1URL: https://wmsc.lcsc.com/wmsc/upload/file/pdf/v2/lcsc/2201270830_Murata-Electronics-GCM0335C1H270JA16D_C1849653.pdf; ComponentLink2Description: JLCPCB Part URL; ComponentLink2URL: https://jlcpcb.com/partdetail/C1849653; ComponentLink3Description: LCSC Part URL; ComponentLink3URL: https://lcsc.com/product-detail/Multilayer-Ceramic-Capacitors-MLCC---SMD-SMT_Murata-Electronics-Murata-Electronics-GCM0335C1H270JA16D_C1849653.html
footprint CAP-0201 (0201 (0603M) Capacitor)
pins: 1, 2

## GCM0335C1H330JA16D
designator C?  Capacitance: 33pF  (hidden comment: *)
Capacitor, Ceramic (MLCC), 33pF, ±5%, 50V, C0G, ±5%, SMD 0201; Manufacturer: Murata Electronics; Manufacturer Part Number: GCM0335C1H330JA16D; Package Size: 0201; JLCPCB Basic Part: No; JLCPCB Part Number: C161137; Supplier 1: LCSC; Category: Capacitors - MLCC; Supplier Part Number 1: C161137; Tolerance: ±5%; Voltage Rating: 50V; Temperature Coefficient: C0G; RoHS: Yes; ComponentLink1Description: Datasheet; ComponentLink1URL: https://wmsc.lcsc.com/wmsc/upload/file/pdf/v2/lcsc/1811081551_Murata-Electronics-GCM0335C1H330JA16D_C161137.pdf; ComponentLink2Description: JLCPCB Part URL; ComponentLink2URL: https://jlcpcb.com/partdetail/C161137; ComponentLink3Description: LCSC Part URL; ComponentLink3URL: https://lcsc.com/product-detail/Multilayer-Ceramic-Capacitors-MLCC---SMD-SMT_Murata-Electronics-Murata-Electronics-GCM0335C1H330JA16D_C161137.html
footprint CAP-0201 (0201 (0603M) Capacitor)
pins: 1, 2

## GJM0335C0J220JB01D
designator C?  Capacitance: 22pF  (hidden comment: *)
Capacitor, Ceramic (MLCC), 22pF, ±5%, 6.3V, C0G, ±5%, SMD 0201; Manufacturer: Murata Electronics; Manufacturer Part Number: GJM0335C0J220JB01D; Package Size: 0201; JLCPCB Basic Part: No; JLCPCB Part Number: C426113; Supplier 1: LCSC; Category: Capacitors - MLCC; Supplier Part Number 1: C426113; Tolerance: ±5%; Voltage Rating: 6.3V; Temperature Coefficient: C0G; RoHS: Yes; ComponentLink1Description: Datasheet; ComponentLink1URL: https://wmsc.lcsc.com/wmsc/upload/file/pdf/v2/lcsc/2304140030_Murata-Electronics-GJM0335C0J220JB01D_C426113.pdf; ComponentLink2Description: JLCPCB Part URL; ComponentLink2URL: https://jlcpcb.com/partdetail/C426113; ComponentLink3Description: LCSC Part URL; ComponentLink3URL: https://lcsc.com/product-detail/Multilayer-Ceramic-Capacitors-MLCC---SMD-SMT_Murata-Electronics-Murata-Electronics-GJM0335C0J220JB01D_C426113.html
footprint CAP-0201 (0201 (0603M) Capacitor)
pins: 1, 2

## GJM0335C1E1R0BB01D
designator C?  Capacitance: 1pF  (hidden comment: *)
Capacitor, Ceramic (MLCC), 1pF, 25V, C0G, SMD 0201; Manufacturer: Murata Electronics; Manufacturer Part Number: GJM0335C1E1R0BB01D; Package Size: 0201; JLCPCB Basic Part: No; JLCPCB Part Number: C91603; Supplier 1: LCSC; Category: Capacitors - MLCC; Supplier Part Number 1: C91603; Voltage Rating: 25V; Temperature Coefficient: C0G; RoHS: Yes; ComponentLink1Description: Datasheet; ComponentLink1URL: https://wmsc.lcsc.com/wmsc/upload/file/pdf/v2/lcsc/1811110911_Murata-Electronics-GJM0335C1E1R0BB01D_C91603.pdf; ComponentLink2Description: JLCPCB Part URL; ComponentLink2URL: https://jlcpcb.com/partdetail/C91603; ComponentLink3Description: LCSC Part URL; ComponentLink3URL: https://lcsc.com/product-detail/Multilayer-Ceramic-Capacitors-MLCC---SMD-SMT_Murata-Electronics-Murata-Electronics-GJM0335C1E1R0BB01D_C91603.html
footprint CAP-0201 (0201 (0603M) Capacitor)
pins: 1, 2